# Altium footprint library Elements_LT.PcbLib: 145 footprints (part 5 of 10)
Each footprint in its own frame and in the unit in brackets; x right, y up, seen from the top. Pads: shape width x height; smd on the part's side, far side on the other; paste and mask are expansions set on the pad; w line width, h text height; cw(c..) or ccw(c..) is an arc to the next point about the centre after c.
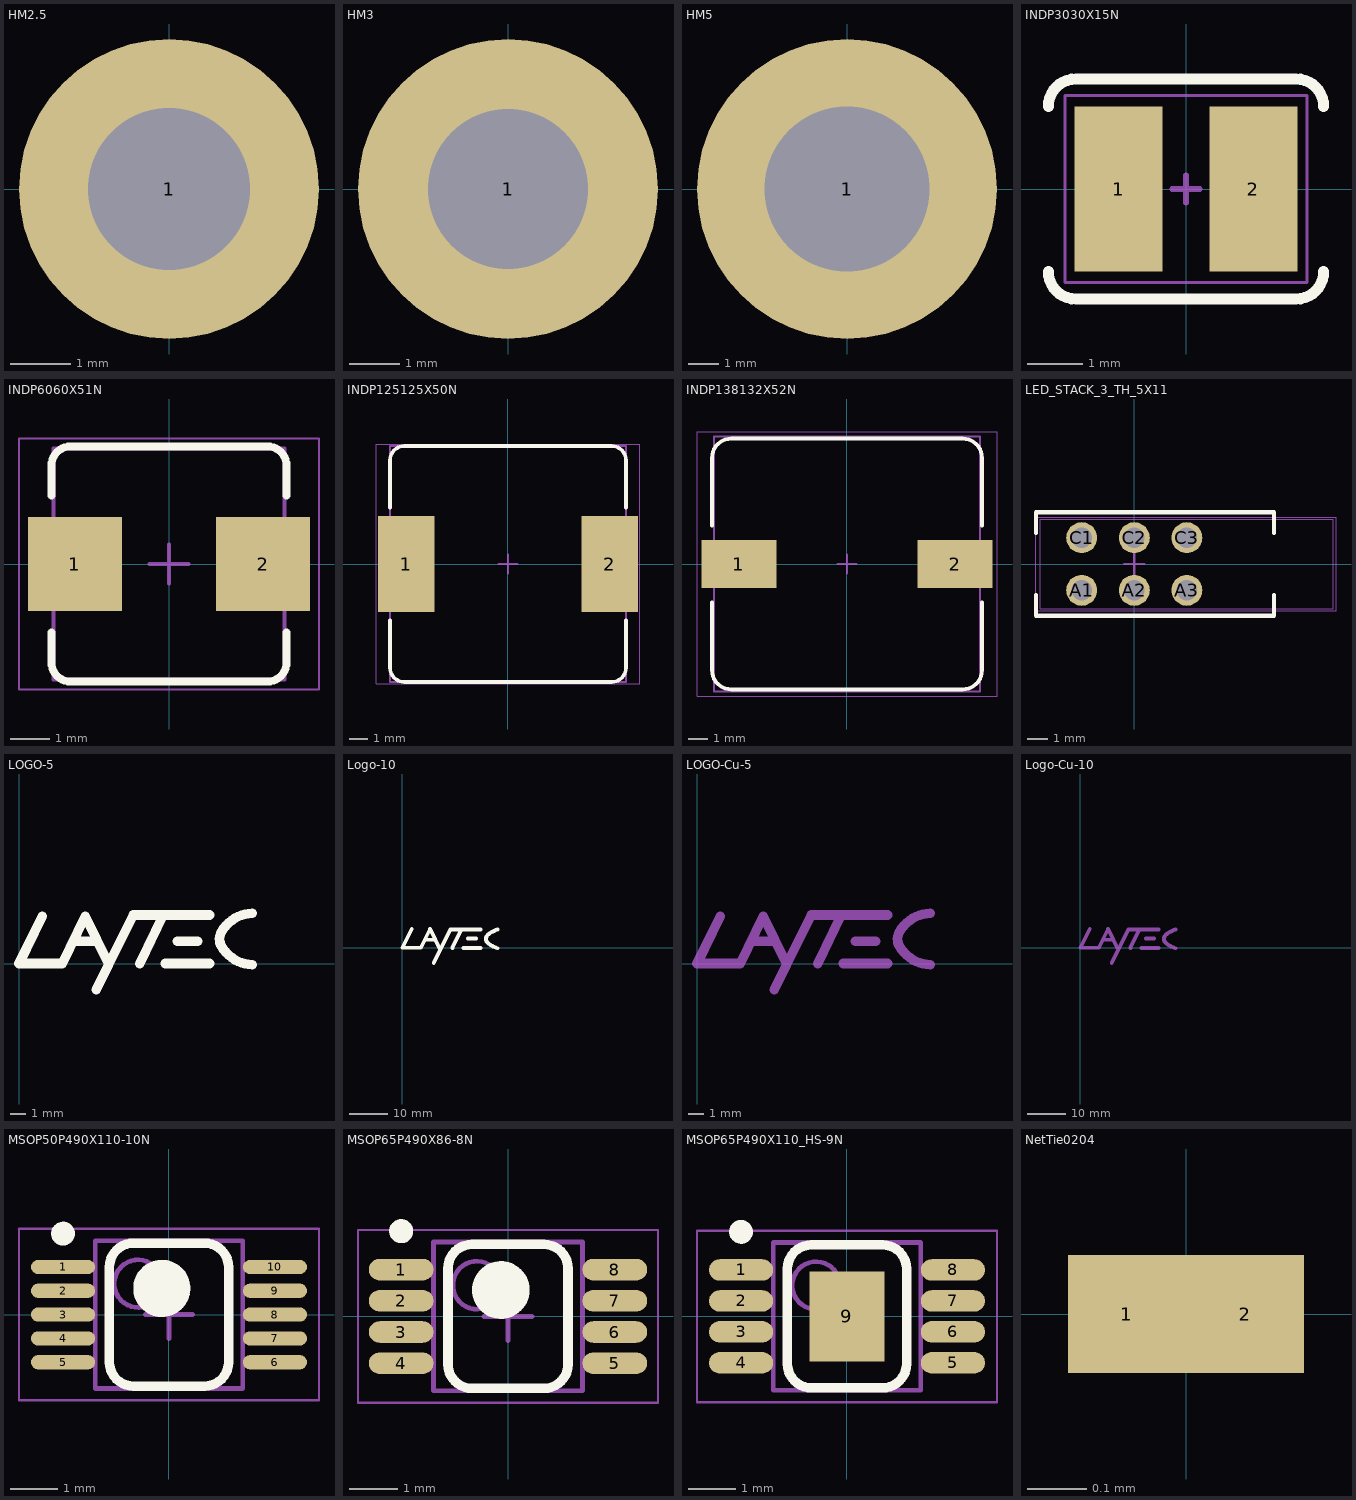
[diagram p4: the footprints below, top view; thin cyan lines are the x and y axes]

## HM2.5 [mm] "Mounting Hole 2.7mm / 5mm"
pads (1):
  round 5 hole 2.7: 1(0,0)

## HM3 [mm] "Mounting Hole 3.2mm / 6mm"
pads (1):
  round 6 hole 3.2: 1(0,0)

## HM5 [mm] "Mounting Hole 5.5mm / 10mm"
pads (1):
  round 10 hole 5.5: 1(0,0)

## INDP3030X15N [mm] "Wire Wound Inductor, 3.00x3.00mm"
height 1.5
pads (2):
  rect 1.6x3 smd: 1(-1.225,0) 2(1.225,0)
Top Overlay:
  lines w0.2: -2.5,1.5 cw(c-2,1.5) -2,2 2,2 cw(c2,1.5) 2.5,1.5 ; 2.5,-1.5 cw(c2,-1.5) 2,-2 -2,-2 cw(c-2,-1.5) -2.5,-1.5 ; -2.5,-1.5 -2.5,-1.5
Mechanical 15:
  lines w0.05: -2.2,-1.7 2.2,-1.7 2.2,1.7 -2.2,1.7 -2.2,-1.7
  lines w0.1: -0.254,0 0.254,0 ; 0,-0.254 0,0.254
3D body "WE-MAPI_3015.stp": height 1.2, standoff 0, extent -1.5,-1.5 1.5,1.5

## INDP6060X51N [mm] "Wire Wound Inductor, 6.0x6.0mm approx"
height 5.1
pads (2):
  rect 2.4x2.4 smd: 1(-2.4,0) 2(2.4,0)
Top Overlay:
  lines w0.2: -3,-1.75 -3,-2.5 ccw(c-2.5,-2.5) -2.5,-3 2.5,-3 ccw(c2.5,-2.5) 3,-2.5 3,-1.75 ; -3,1.75 -3,2.5 cw(c-2.5,2.5) -2.5,3 2.5,3 cw(c2.5,2.5) 3,2.5 3,1.75
Mechanical 13:
  lines w0.1: -2.95,-2.95 -2.95,2.95 2.95,2.95 2.95,-2.95 -2.95,-2.95
Mechanical 15:
  lines w0.05: -3.825,-3.2 -3.825,3.2 3.825,3.2 3.825,-3.2 -3.825,-3.2
  lines w0.1: -0.5,0 0.5,0 ; 0,-0.5 0,0.5
3D body "Inductor_63.step": height 3, standoff 0, extent -4.525,-4.525 4.526,4.526

## INDP125125X50N [mm] "Wire Wound Inductor, 12.50x12.50mm"
height 5
pads (2):
  rect 3x5.1 smd: 1(-5.4,0) 2(5.4,0)
Top Overlay:
  lines w0.2: -6.25,-3 -6.25,-5.5 ccw(c-5.5,-5.5) -5.5,-6.25 5.5,-6.25 ccw(c5.5,-5.5) 6.25,-5.5 6.25,-3 ; -6.25,3 -6.25,5.5 cw(c-5.5,5.5) -5.5,6.25 5.5,6.25 cw(c5.5,5.5) 6.25,5.5 6.25,3
Mechanical 13:
  lines w0.1: -6.25,-6.25 -6.25,6.25 6.25,6.25 6.25,-6.25 -6.25,-6.25
Mechanical 15:
  lines w0.05: -6.985,-6.35 -6.985,6.35 6.985,6.35 6.985,-6.35 -6.985,-6.35
  lines w0.1: -0.5,0 0.5,0 ; 0,-0.5 0,0.5
3D body "DR125 series.stp": height 5.92, standoff 0.02, extent -6,-6 6,6

## INDP138132X52N [mm] "Wire Wound Inductor, 13.80x13.20mm"
height 5.2
pads (2):
  rect 3.9x2.5 smd: 1(-5.6,0) 2(5.6,0)
Top Overlay:
  lines w0.2: -7,-2 -7,-5.5 ccw(c-6,-5.5) -6,-6.5 6,-6.5 ccw(c6,-5.5) 7,-5.5 7,-2 ; -7,2 -7,5.5 cw(c-6,5.5) -6,6.5 6,6.5 cw(c6,5.5) 7,5.5 7,2
Mechanical 13:
  lines w0.1: -6.9,-6.6 -6.9,6.6 6.9,6.6 6.9,-6.6 -6.9,-6.6
Mechanical 15:
  lines w0.05: -7.775,-6.85 -7.775,6.85 7.775,6.85 7.775,-6.85 -7.775,-6.85
  lines w0.1: -0.5,0 0.5,0 ; 0,-0.5 0,0.5
3D body "INDP138132X52N.step": height 5.3, standoff 0, extent -7,-6.6 7,6.6

## LED_STACK_3_TH_5X11 [mm] "LED Stack; 3 LEDs"
height 15.24
pads (6):
  round 1.5 hole 1: A1(-2.54,-1.27) A2(0,-1.27) A3(2.54,-1.27) C1(-2.54,1.27) C2(0,1.27) C3(2.54,1.27)
Top Overlay:
  lines w0.2: -4.75,-1.5 -4.75,-2.5 5,-2.5 6.75,-2.5 6.75,-1.5 ; -4.75,1.5 -4.75,2.5 5,2.5 6.75,2.5 6.75,1.5
Mechanical 13:
  lines w0.05: -4.547,-2.159 -4.547,2.159 9.627,2.159 9.627,-2.159 -4.547,-2.159
Mechanical 15:
  lines w0.05: -4.75,-2.25 -4.75,2.25 9.75,2.25 9.75,-2.25 -4.75,-2.25
  lines w0.1: -0.5,0 0.5,0 ; 0,-0.5 0,0.5
3D body "5640700xxxf.stp": height 15.24, standoff -3.68, extent -4.547,-2.159 9.627,2.159

## LOGO-5 [mm] "LayTec Logo, 5mm, Overlay"
Top Overlay:
  lines w0.6: 1.458,2.969 0,0 2.716,0 4.171,2.964 5.649,-0.053 ; 3.418,1.409 4.893,1.409 ; 4.858,-1.651 5.649,-0.053 ; 7.594,-0.003 9.066,3.048 11.968,3.048 ; 9.176,0 11.97,0 ; 9.938,1.397 11.219,1.397 ; 11.067,3.048 7.168,3.048 5.649,-0.053 ; 12.603,1.438 ccw(c14.31,1.852) 12.695,1.161 ccw(c14.065,1.747) 12.975,0.731 ; 12.606,1.654 cw(c14.31,1.228) 12.695,1.919 cw(c14.065,1.333) 12.975,2.349 cw(c15.457,0.036) 13.355,2.699 cw(c14.667,1.012) 14.65,3.149 ; 12.675,1.164 cw(c13.447,1.528) 12.692,1.927 ; 12.975,0.731 ccw(c15.457,3.044) 13.355,0.381 ccw(c14.667,2.068) 14.649,-0.069

## Logo-10 [mm] "LayTec Logo, 10mm, Overlay"
Top Overlay:
  lines w1: 2.42,4.93 0,0 4.78,0 7.2,4.93 ; 5.81,2.09 8.59,2.09 ; 7.23,4.93 9.9,-0.52 ; 8.2,-3.99 12.51,4.81 15.43,4.81 ; 13.07,-0.01 15.43,4.81 ; 15.92,-0.01 20.44,-0.01 ; 17.1,2.42 19.27,2.42 ; 20.46,4.81 15.43,4.81 ; 23.01,0.75 cw(c25.929,5.281) 22.59,1.05 cw(c24.693,3.714) 22.21,1.4 cw(c23.3,2.416) 21.93,1.83 cw(c23.546,2.521) 21.8,2.32 cw(c21.974,2.34) 21.8,2.36 cw(c23.545,2.159) 21.93,2.85 cw(c23.3,2.264) 22.21,3.28 cw(c24.692,0.967) 22.59,3.63 cw(c25.931,-0.603) 23.01,3.93 ; 23.01,0.75 ccw(c25.917,5.262) 23.46,0.49 ; 23.01,3.93 cw(c25.916,-0.58) 23.46,4.19 cw(c33.423,-15.149) 23.92,4.42 cw(c26.822,-1.564) 24.4,4.63 24.86,4.81 ; 23.46,0.49 ccw(c33.401,19.797) 23.92,0.26 ccw(c26.824,6.244) 24.4,0.05 24.86,-0.13

## LOGO-Cu-5 [mm] "LayTec Logo, 5mm, Copper"
Top Solder:
  lines w0.6: 1.458,2.969 0,0 2.716,0 4.171,2.964 5.649,-0.053 ; 3.418,1.409 4.893,1.409 ; 4.858,-1.651 5.649,-0.053 ; 7.594,-0.003 9.066,3.048 11.968,3.048 ; 9.176,0 11.97,0 ; 9.938,1.397 11.219,1.397 ; 11.067,3.048 7.168,3.048 5.649,-0.053 ; 12.603,1.438 ccw(c14.31,1.852) 12.695,1.161 ccw(c14.065,1.747) 12.975,0.731 ; 12.606,1.654 cw(c14.31,1.228) 12.695,1.919 cw(c14.065,1.333) 12.975,2.349 cw(c15.457,0.036) 13.355,2.699 cw(c14.667,1.012) 14.65,3.149 ; 12.675,1.164 cw(c13.447,1.528) 12.692,1.927 ; 12.975,0.731 ccw(c15.457,3.044) 13.355,0.381 ccw(c14.667,2.068) 14.649,-0.069

## Logo-Cu-10 [mm] "LayTec Logo, 10mm, Copper"
Top Solder:
  lines w1: 2.42,4.93 0,0 4.78,0 7.2,4.93 ; 5.81,2.09 8.59,2.09 ; 7.23,4.93 9.9,-0.52 ; 8.2,-3.99 12.51,4.81 15.43,4.81 ; 13.07,-0.01 15.43,4.81 ; 15.92,-0.01 20.44,-0.01 ; 17.1,2.42 19.27,2.42 ; 20.46,4.81 15.43,4.81 ; 23.01,0.75 cw(c25.929,5.281) 22.59,1.05 cw(c24.693,3.714) 22.21,1.4 cw(c23.3,2.416) 21.93,1.83 cw(c23.546,2.521) 21.8,2.32 cw(c21.974,2.34) 21.8,2.36 cw(c23.545,2.159) 21.93,2.85 cw(c23.3,2.264) 22.21,3.28 cw(c24.692,0.967) 22.59,3.63 cw(c25.931,-0.603) 23.01,3.93 ; 23.01,0.75 ccw(c25.917,5.262) 23.46,0.49 ; 23.01,3.93 cw(c25.916,-0.58) 23.46,4.19 cw(c33.423,-15.149) 23.92,4.42 cw(c26.822,-1.564) 24.4,4.63 24.86,4.81 ; 23.46,0.49 ccw(c33.401,19.797) 23.92,0.26 ccw(c26.824,6.244) 24.4,0.05 24.86,-0.13

## MSOP50P490X110-10N [mm] "MSOP, 10-Leads, Body 3.00x3.00mm, Pitch 0.50mm, IPC Medium Density"
height 1.1
pads (10):
  oval 1.35x0.3 smd: 1(-2.225,1) 2(-2.225,0.5) 3(-2.225,0) 4(-2.225,-0.5) 5(-2.225,-1) 6(2.225,-1) 7(2.225,-0.5) 8(2.225,0) 9(2.225,0.5) 10(2.225,1)
Top Overlay:
  circle w0.6: c-0.15,0.55 r0.3
  circle w0.25: c-2.225,1.7 r0.125
  lines w0.2: -1.25,-1 ccw(c-0.75,-1) -0.75,-1.5 0.75,-1.5 ccw(c0.75,-1) 1.25,-1 1.25,1 ccw(c0.75,1) 0.75,1.5 -0.75,1.5 ccw(c-0.75,1) -1.25,1 -1.25,-1
Mechanical 13:
  circle w0.1: c-0.65,0.65 r0.5
  lines w0.1: -1.55,-1.55 1.55,-1.55 1.55,1.55 -1.55,1.55 -1.55,-1.55
Mechanical 15:
  lines w0.05: -3.15,-1.8 3.15,-1.8 3.15,1.8 -3.15,1.8 -3.15,-1.8
  lines w0.1: -0.5,0 0.5,0 ; 0,-0.5 0,0.5
3D body "MO-187BA-T.stp": height 1.05, standoff 0, extent -2.525,-1.55 2.525,1.55

## MSOP65P490X86-8N [mm] "TSOP, 8-Leads, Body 3.00x3.00mm, Pitch 0.65mm, IPC Medium Density"
height 0.86
pads (8):
  oval 1.35x0.45 smd: 1(-2.225,0.975) 2(-2.225,0.325) 3(-2.225,-0.325) 4(-2.225,-0.975) 5(2.225,-0.975) 6(2.225,-0.325) 7(2.225,0.325) 8(2.225,0.975)
Top Overlay:
  circle w0.6: c-0.15,0.55 r0.3
  circle w0.25: c-2.225,1.775 r0.125
  lines w0.2: -1.25,-1 ccw(c-0.75,-1) -0.75,-1.5 0.75,-1.5 ccw(c0.75,-1) 1.25,-1 1.25,1 ccw(c0.75,1) 0.75,1.5 -0.75,1.5 ccw(c-0.75,1) -1.25,1 -1.25,-1
Mechanical 13:
  circle w0.1: c-0.65,0.65 r0.5
  lines w0.1: -1.55,-1.55 1.55,-1.55 1.55,1.55 -1.55,1.55 -1.55,-1.55
Mechanical 15:
  lines w0.05: -3.125,-1.8 3.125,-1.8 3.125,1.8 -3.125,1.8 -3.125,-1.8
  lines w0.1: -0.5,0 0.5,0 ; 0,-0.5 0,0.5
3D body "MO-187AA.stp": height 1.1, standoff 0, extent -2.525,-1.55 2.525,1.55

## MSOP65P490X110_HS-9N [mm] "MSOP, 8-Leads, Body 3.00x3.00mm, Pitch 0.65mm, Thermal Pad 1.89x1.57mm, IPC Medium Density"
height 1.1
pads (9):
  oval 1.35x0.45 smd: 1(-2.225,0.975) 2(-2.225,0.325) 3(-2.225,-0.325) 4(-2.225,-0.975) 5(2.225,-0.975) 6(2.225,-0.325) 7(2.225,0.325) 8(2.225,0.975)
  rect 1.57x1.89 smd: 9(0,0)
Top Overlay:
  circle w0.25: c-2.225,1.775 r0.125
  lines w0.2: -1.25,-1 ccw(c-0.75,-1) -0.75,-1.5 0.75,-1.5 ccw(c0.75,-1) 1.25,-1 1.25,1 ccw(c0.75,1) 0.75,1.5 -0.75,1.5 ccw(c-0.75,1) -1.25,1 -1.25,-1
Mechanical 13:
  circle w0.1: c-0.65,0.65 r0.5
  lines w0.1: -1.55,-1.55 1.55,-1.55 1.55,1.55 -1.55,1.55 -1.55,-1.55
Mechanical 15:
  lines w0.05: -3.15,-1.8 3.15,-1.8 3.15,1.8 -3.15,1.8 -3.15,-1.8
  lines w0.1: -0.5,0 0.5,0 ; 0,-0.5 0,0.5
3D body "MO-187AA.stp": height 1.1, standoff 0, extent -2.525,-1.55 2.525,1.55

## NetTie0204 [mm] "Net Tie, 0.2 x 0.4mm"
pads (2):
  rect 0.2x0.2 smd: 1(-0.1,0) 2(0.1,0)